# Altium footprint library LimeMicroAltiumLib_pcbLib.PcbLib: 279 footprints (part 6 of 18) (continued)
## FMC_LPC_conn [mm] (continued)
3D body: height 6.55, standoff 2.16, extent -1.799,-23.241 -0.828,-22.479
3D body: height 6.55, standoff 2.16, extent -1.799,-21.971 -0.828,-21.209
3D body: height 6.55, standoff 2.16, extent -1.799,-20.701 -0.828,-19.939
3D body: height 6.55, standoff 2.16, extent -1.799,-19.431 -0.828,-18.669
3D body: height 6.55, standoff 2.16, extent -1.799,-18.161 -0.828,-17.399
3D body: height 6.55, standoff 2.16, extent -1.799,-16.891 -0.828,-16.129
3D body: height 6.55, standoff 2.16, extent -1.799,-15.621 -0.828,-14.859
3D body: height 6.55, standoff 2.16, extent -1.799,-14.351 -0.828,-13.589
3D body: height 6.55, standoff 2.16, extent -1.799,-13.081 -0.828,-12.319
3D body: height 6.55, standoff 2.16, extent -1.799,-11.811 -0.828,-11.049
3D body: height 6.55, standoff 2.16, extent -1.799,-10.541 -0.828,-9.779
3D body: height 6.55, standoff 2.16, extent -1.799,-9.271 -0.828,-8.509
3D body: height 6.55, standoff 2.16, extent -1.799,-8.001 -0.828,-7.239
3D body: height 6.55, standoff 2.16, extent -1.799,-6.731 -0.828,-5.969
3D body: height 6.55, standoff 2.16, extent -1.799,-5.461 -0.828,-4.699
3D body: height 6.55, standoff 2.16, extent -1.799,-4.191 -0.828,-3.429
3D body: height 6.55, standoff 2.16, extent -1.799,-2.921 -0.828,-2.159
3D body: height 6.55, standoff 2.16, extent -1.799,-1.651 -0.828,-0.889
3D body: height 6.55, standoff 2.16, extent -1.799,-0.381 -0.828,0.381
3D body: height 6.55, standoff 2.16, extent -1.799,0.889 -0.828,1.651
3D body: height 6.55, standoff 2.16, extent -1.799,2.159 -0.828,2.921
3D body: height 6.55, standoff 2.16, extent -1.799,3.429 -0.828,4.191
3D body: height 6.55, standoff 2.16, extent -1.799,4.699 -0.828,5.461
3D body: height 6.55, standoff 2.16, extent -1.799,5.969 -0.828,6.731
3D body: height 6.55, standoff 2.16, extent -1.799,7.239 -0.828,8.001
3D body: height 6.55, standoff 2.16, extent -1.799,8.509 -0.828,9.271
3D body: height 6.55, standoff 2.16, extent -1.799,9.779 -0.828,10.541
3D body: height 6.55, standoff 2.16, extent -1.799,11.049 -0.828,11.811
3D body: height 6.55, standoff 2.16, extent -1.799,12.319 -0.828,13.081
3D body: height 6.55, standoff 2.16, extent -1.799,13.589 -0.828,14.351
3D body: height 6.55, standoff 2.16, extent -1.799,14.859 -0.828,15.621
3D body: height 6.55, standoff 2.16, extent -1.799,16.129 -0.828,16.891
3D body: height 6.55, standoff 2.16, extent -1.799,17.399 -0.828,18.161
3D body: height 6.55, standoff 2.16, extent -1.799,18.669 -0.828,19.431
3D body: height 6.55, standoff 2.16, extent -1.799,19.939 -0.828,20.701
3D body: height 6.55, standoff 2.16, extent -1.799,21.209 -0.828,21.971
3D body: height 6.55, standoff 2.16, extent -1.799,22.479 -0.828,23.241
3D body: height 6.55, standoff 2.16, extent -1.799,23.749 -0.828,24.511
3D body: height 6.55, standoff 2.16, extent -1.799,25.019 -0.828,25.502
3D body: height 6.24, standoff 2.16, extent -1.383,-25.019 -1.244,25.019
3D body: height 6.55, standoff 2.16, extent -4.339,-25.502 -3.368,-25.019
3D body: height 6.55, standoff 2.16, extent -4.339,-24.511 -3.368,-23.749
3D body: height 6.55, standoff 2.16, extent -4.339,-23.241 -3.368,-22.479
3D body: height 6.55, standoff 2.16, extent -4.339,-21.971 -3.368,-21.209
3D body: height 6.55, standoff 2.16, extent -4.339,-20.701 -3.368,-19.939
3D body: height 6.55, standoff 2.16, extent -4.339,-19.431 -3.368,-18.669
3D body: height 6.55, standoff 2.16, extent -4.339,-18.161 -3.368,-17.399
3D body: height 6.55, standoff 2.16, extent -4.339,-16.891 -3.368,-16.129
3D body: height 6.55, standoff 2.16, extent -4.339,-15.621 -3.368,-14.859
3D body: height 6.55, standoff 2.16, extent -4.339,-14.351 -3.368,-13.589
3D body: height 6.55, standoff 2.16, extent -4.339,-13.081 -3.368,-12.319
3D body: height 6.55, standoff 2.16, extent -4.339,-11.811 -3.368,-11.049
3D body: height 6.55, standoff 2.16, extent -4.339,-10.541 -3.368,-9.779
3D body: height 6.55, standoff 2.16, extent -4.339,-9.271 -3.368,-8.509
3D body: height 6.55, standoff 2.16, extent -4.339,-8.001 -3.368,-7.239
3D body: height 6.55, standoff 2.16, extent -4.339,-6.731 -3.368,-5.969
3D body: height 6.55, standoff 2.16, extent -4.339,-5.461 -3.368,-4.699
3D body: height 6.55, standoff 2.16, extent -4.339,-4.191 -3.368,-3.429
3D body: height 6.55, standoff 2.16, extent -4.339,-2.921 -3.368,-2.159
3D body: height 6.55, standoff 2.16, extent -4.339,-1.651 -3.368,-0.889
3D body: height 6.55, standoff 2.16, extent -4.339,-0.381 -3.368,0.381
3D body: height 6.55, standoff 2.16, extent -4.339,0.889 -3.368,1.651
3D body: height 6.55, standoff 2.16, extent -4.339,2.159 -3.368,2.921
3D body: height 6.55, standoff 2.16, extent -4.339,3.429 -3.368,4.191
3D body: height 6.55, standoff 2.16, extent -4.339,4.699 -3.368,5.461
3D body: height 6.55, standoff 2.16, extent -4.339,5.969 -3.368,6.731
3D body: height 6.55, standoff 2.16, extent -4.339,7.239 -3.368,8.001
3D body: height 6.55, standoff 2.16, extent -4.339,8.509 -3.368,9.271
3D body: height 6.55, standoff 2.16, extent -4.339,9.779 -3.368,10.541
3D body: height 6.55, standoff 2.16, extent -4.339,11.049 -3.368,11.811
3D body: height 6.55, standoff 2.16, extent -4.339,12.319 -3.368,13.081
3D body: height 6.55, standoff 2.16, extent -4.339,13.589 -3.368,14.351
3D body: height 6.55, standoff 2.16, extent -4.339,14.859 -3.368,15.621
3D body: height 6.55, standoff 2.16, extent -4.339,16.129 -3.368,16.891
3D body: height 6.55, standoff 2.16, extent -4.339,17.399 -3.368,18.161
3D body: height 6.55, standoff 2.16, extent -4.339,18.669 -3.368,19.431
3D body: height 6.55, standoff 2.16, extent -4.339,19.939 -3.368,20.701
3D body: height 6.55, standoff 2.16, extent -4.339,21.209 -3.368,21.971
3D body: height 6.55, standoff 2.16, extent -4.339,22.479 -3.368,23.241
3D body: height 6.55, standoff 2.16, extent -4.339,23.749 -3.368,24.511
3D body: height 6.55, standoff 2.16, extent -4.339,25.019 -3.368,25.502
3D body: height 6.24, standoff 2.16, extent -3.923,-25.019 -3.784,25.019
3D body: height 3.51, standoff 1.92, extent -6.659,-28.728 6.576,28.728
3D body: height 2, standoff -1.27, extent 2.503,26.74 3.597,27.619
3D body: height 6.55, standoff 2.16, extent 5.812,-28.727 6.577,27.891
3D body: height 6.55, standoff 2.16, extent -6.662,-28.727 -5.897,27.89
3D body: height 6.24, standoff 2.16, extent 3.697,-25.019 3.836,25.019

## FMC_LPC_female_conn [mm]
pads (164):
  round 0.9 smd: C1(3.175,-24.765) C2(3.175,-23.495) C3(3.175,-22.225) C4(3.175,-20.955) C5(3.175,-19.685) C6(3.175,-18.415) C7(3.175,-17.145) C8(3.175,-15.875) C9(3.175,-14.605) C10(3.175,-13.335) C11(3.175,-12.065) C12(3.175,-10.795) C13(3.175,-9.525) C14(3.175,-8.255) C15(3.175,-6.985) C16(3.175,-5.715) C17(3.175,-4.445) C18(3.175,-3.175) C19(3.175,-1.905) C20(3.175,-0.635) C21(3.175,0.635) C22(3.175,1.905) C23(3.175,3.175) C24(3.175,4.445) C25(3.175,5.715) C26(3.175,6.985) C27(3.175,8.255) C28(3.175,9.525) C29(3.175,10.795) C30(3.175,12.065) C31(3.175,13.335) C32(3.175,14.605) C33(3.175,15.875) C34(3.175,17.145) C35(3.175,18.415) C36(3.175,19.685) C37(3.175,20.955) C38(3.175,22.225) C39(3.175,23.495) C40(3.175,24.765) D1(1.905,-24.765) D2(1.905,-23.495) D3(1.905,-22.225) D4(1.905,-20.955) D5(1.905,-19.685) D6(1.905,-18.415) D7(1.905,-17.145) D8(1.905,-15.875) D9(1.905,-14.605) D10(1.905,-13.335) D11(1.905,-12.065) D12(1.905,-10.795) D13(1.905,-9.525) D14(1.905,-8.255) D15(1.905,-6.985) D16(1.905,-5.715) D17(1.905,-4.445) D18(1.905,-3.175) D19(1.905,-1.905) D20(1.905,-0.635) D21(1.905,0.635) D22(1.905,1.905) D23(1.905,3.175) D24(1.905,4.445) D25(1.905,5.715) D26(1.905,6.985) D27(1.905,8.255) D28(1.905,9.525) D29(1.905,10.795) D30(1.905,12.065) D31(1.905,13.335) D32(1.905,14.605) D33(1.905,15.875) D34(1.905,17.145) D35(1.905,18.415) D36(1.905,19.685) D37(1.905,20.955) D38(1.905,22.225) D39(1.905,23.495) D40(1.905,24.765) G1(-1.905,-24.765) G2(-1.905,-23.495) G3(-1.905,-22.225) G4(-1.905,-20.955) G5(-1.905,-19.685) G6(-1.905,-18.415) G7(-1.905,-17.145) G8(-1.905,-15.875) G9(-1.905,-14.605) G10(-1.905,-13.335) G11(-1.905,-12.065) G12(-1.905,-10.795) G13(-1.905,-9.525) G14(-1.905,-8.255) G15(-1.905,-6.985) G16(-1.905,-5.715) G17(-1.905,-4.445) G18(-1.905,-3.175) G19(-1.905,-1.905) G20(-1.905,-0.635) G21(-1.905,0.635) G22(-1.905,1.905) G23(-1.905,3.175) G24(-1.905,4.445) G25(-1.905,5.715) G26(-1.905,6.985) G27(-1.905,8.255) G28(-1.905,9.525) G29(-1.905,10.795) G30(-1.905,12.065) G31(-1.905,13.335) G32(-1.905,14.605) G33(-1.905,15.875) G34(-1.905,17.145) G35(-1.905,18.415) G36(-1.905,19.685) G37(-1.905,20.955) G38(-1.905,22.225) G39(-1.905,23.495) G40(-1.905,24.765) H1(-3.175,-24.765) H2(-3.175,-23.495) H3(-3.175,-22.225) H4(-3.175,-20.955) H5(-3.175,-19.685) H6(-3.175,-18.415) H7(-3.175,-17.145) H8(-3.175,-15.875) H9(-3.175,-14.605) H10(-3.175,-13.335) H11(-3.175,-12.065) H12(-3.175,-10.795) H13(-3.175,-9.525) H14(-3.175,-8.255) H15(-3.175,-6.985) H16(-3.175,-5.715) H17(-3.175,-4.445) H18(-3.175,-3.175) H19(-3.175,-1.905) H20(-3.175,-0.635) H21(-3.175,0.635) H22(-3.175,1.905) H23(-3.175,3.175) H24(-3.175,4.445) H25(-3.175,5.715) H26(-3.175,6.985) H27(-3.175,8.255) H28(-3.175,9.525) H29(-3.175,10.795) H30(-3.175,12.065) H31(-3.175,13.335) H32(-3.175,14.605) H33(-3.175,15.875) H34(-3.175,17.145) H35(-3.175,18.415) H36(-3.175,19.685) H37(-3.175,20.955) H38(-3.175,22.225) H39(-3.175,23.495) H40(-3.175,24.765)
  round 3.2 hole 2.7: MH1(-1.98,-31.5) MH2(-1.98,31.5)
  round 0.97 hole 1.27 unplated: MH1(0,-27.18) MH2(-3.05,27.18)
Top Layer keep-out:
  region: -1.98,28.6 -2.17,28.6 -2.547,28.65 -2.914,28.748 -3.265,28.893 -3.595,29.084 -3.896,29.315 -4.165,29.584 -4.396,29.885 -4.587,30.215 -4.732,30.566 -4.83,30.933 -4.88,31.31 -4.88,31.5 -4.88,31.69 -4.83,32.067 -4.732,32.434 -4.587,32.785 -4.396,33.115 -4.165,33.416 -3.896,33.685 -3.595,33.916 -3.265,34.107 -2.914,34.252 -2.547,34.35 -2.17,34.4 -1.98,34.4 -1.79,34.4 -1.413,34.35 -1.046,34.252 -0.695,34.107 -0.365,33.916 -0.064,33.685 0.205,33.416 0.436,33.115 0.627,32.785 0.772,32.434 0.87,32.067 0.92,31.69 0.92,31.5 0.92,31.31 0.87,30.933 0.772,30.566 0.627,30.215 0.436,29.885 0.205,29.584 -0.064,29.315 -0.365,29.084 -0.695,28.893 -1.046,28.748 -1.413,28.65 -1.79,28.6
  region: -1.98,-34.4 -2.17,-34.4 -2.547,-34.35 -2.914,-34.252 -3.265,-34.107 -3.595,-33.916 -3.896,-33.685 -4.165,-33.416 -4.396,-33.115 -4.587,-32.785 -4.732,-32.434 -4.83,-32.067 -4.88,-31.69 -4.88,-31.5 -4.88,-31.31 -4.83,-30.933 -4.732,-30.566 -4.587,-30.215 -4.396,-29.885 -4.165,-29.584 -3.896,-29.315 -3.595,-29.084 -3.265,-28.893 -2.914,-28.748 -2.547,-28.65 -2.17,-28.6 -1.98,-28.6 -1.79,-28.6 -1.413,-28.65 -1.046,-28.748 -0.695,-28.893 -0.365,-29.084 -0.064,-29.315 0.205,-29.584 0.436,-29.885 0.627,-30.215 0.772,-30.566 0.87,-30.933 0.92,-31.31 0.92,-31.5 0.92,-31.69 0.87,-32.067 0.772,-32.434 0.627,-32.785 0.436,-33.115 0.205,-33.416 -0.064,-33.685 -0.365,-33.916 -0.695,-34.107 -1.046,-34.252 -1.413,-34.35 -1.79,-34.4
Top Overlay:
  lines w0.2: -6.662,-27.89 -6.662,28.727 ; -6.66,-27.889 -0.5,-27.889 -0.5,-28.727 0.5,-28.727 0.5,-27.9 0.511,-27.889 4,-27.889 6.573,-27.889 6.573,28.727 ; -6.66,28.727 2.153,28.727 6.574,28.727
  text "K" at -5.3,29.375 h1.1
  text "A" at 6.3,29.5 h1.1
  text "1" at -7.5,-25 h1.1
  text "40" at -7.6,23.7 h1.1
Mechanical 15:
  lines w0.1: -0.5,0 0.5,0 ; 0,-0.5 0,0.5 ; -6.862,-28.089 -6.862,28.927 -2.041,28.927 1.953,28.927 6.773,28.927 6.773,-28.089 0.5,-28.089 0.5,-28.927 -0.5,-28.927 -0.5,-28.089 -6.862,-28.089
  text "40" at -4.6,23.6 h1.1
  text "1" at -4.4,-24.9 h1.1
  text "A" at 4.65,25.875 h1.1
  text "K" at -4.05,26.225 h1.1
  text ".Designator" at 0,0 h0.7

## FMC_LPC_male [mm]
pads (164):
  round 0.9 smd: C1(3.175,-24.765) C2(3.175,-23.495) C3(3.175,-22.225) C4(3.175,-20.955) C5(3.175,-19.685) C6(3.175,-18.415) C7(3.175,-17.145) C8(3.175,-15.875) C9(3.175,-14.605) C10(3.175,-13.335) C11(3.175,-12.065) C12(3.175,-10.795) C13(3.175,-9.525) C14(3.175,-8.255) C15(3.175,-6.985) C16(3.175,-5.715) C17(3.175,-4.445) C18(3.175,-3.175) C19(3.175,-1.905) C20(3.175,-0.635) C21(3.175,0.635) C22(3.175,1.905) C23(3.175,3.175) C24(3.175,4.445) C25(3.175,5.715) C26(3.175,6.985) C27(3.175,8.255) C28(3.175,9.525) C29(3.175,10.795) C30(3.175,12.065) C31(3.175,13.335) C32(3.175,14.605) C33(3.175,15.875) C34(3.175,17.145) C35(3.175,18.415) C36(3.175,19.685) C37(3.175,20.955) C38(3.175,22.225) C39(3.175,23.495) C40(3.175,24.765) D1(1.905,-24.765) D2(1.905,-23.495) D3(1.905,-22.225) D4(1.905,-20.955) D5(1.905,-19.685) D6(1.905,-18.415) D7(1.905,-17.145) D8(1.905,-15.875) D9(1.905,-14.605) D10(1.905,-13.335) D11(1.905,-12.065) D12(1.905,-10.795) D13(1.905,-9.525) D14(1.905,-8.255) D15(1.905,-6.985) D16(1.905,-5.715) D17(1.905,-4.445) D18(1.905,-3.175) D19(1.905,-1.905) D20(1.905,-0.635) D21(1.905,0.635) D22(1.905,1.905) D23(1.905,3.175) D24(1.905,4.445) D25(1.905,5.715) D26(1.905,6.985) D27(1.905,8.255) D28(1.905,9.525) D29(1.905,10.795) D30(1.905,12.065) D31(1.905,13.335) D32(1.905,14.605) D33(1.905,15.875) D34(1.905,17.145) D35(1.905,18.415) D36(1.905,19.685) D37(1.905,20.955) D38(1.905,22.225) D39(1.905,23.495) D40(1.905,24.765) G1(-1.905,-24.765) G2(-1.905,-23.495) G3(-1.905,-22.225) G4(-1.905,-20.955) G5(-1.905,-19.685) G6(-1.905,-18.415) G7(-1.905,-17.145) G8(-1.905,-15.875) G9(-1.905,-14.605) G10(-1.905,-13.335) G11(-1.905,-12.065) G12(-1.905,-10.795) G13(-1.905,-9.525) G14(-1.905,-8.255) G15(-1.905,-6.985) G16(-1.905,-5.715) G17(-1.905,-4.445) G18(-1.905,-3.175) G19(-1.905,-1.905) G20(-1.905,-0.635) G21(-1.905,0.635) G22(-1.905,1.905) G23(-1.905,3.175) G24(-1.905,4.445) G25(-1.905,5.715) G26(-1.905,6.985) G27(-1.905,8.255) G28(-1.905,9.525) G29(-1.905,10.795) G30(-1.905,12.065) G31(-1.905,13.335) G32(-1.905,14.605) G33(-1.905,15.875) G34(-1.905,17.145) G35(-1.905,18.415) G36(-1.905,19.685) G37(-1.905,20.955) G38(-1.905,22.225) G39(-1.905,23.495) G40(-1.905,24.765) H1(-3.175,-24.765) H2(-3.175,-23.495) H3(-3.175,-22.225) H4(-3.175,-20.955) H5(-3.175,-19.685) H6(-3.175,-18.415) H7(-3.175,-17.145) H8(-3.175,-15.875) H9(-3.175,-14.605) H10(-3.175,-13.335) H11(-3.175,-12.065) H12(-3.175,-10.795) H13(-3.175,-9.525) H14(-3.175,-8.255) H15(-3.175,-6.985) H16(-3.175,-5.715) H17(-3.175,-4.445) H18(-3.175,-3.175) H19(-3.175,-1.905) H20(-3.175,-0.635) H21(-3.175,0.635) H22(-3.175,1.905) H23(-3.175,3.175) H24(-3.175,4.445) H25(-3.175,5.715) H26(-3.175,6.985) H27(-3.175,8.255) H28(-3.175,9.525) H29(-3.175,10.795) H30(-3.175,12.065) H31(-3.175,13.335) H32(-3.175,14.605) H33(-3.175,15.875) H34(-3.175,17.145) H35(-3.175,18.415) H36(-3.175,19.685) H37(-3.175,20.955) H38(-3.175,22.225) H39(-3.175,23.495) H40(-3.175,24.765)
  round 3.2 hole 2.7: MH1(-1.98,-31.5) MH2(-1.98,31.5)
  round 0.97 hole 1.27 unplated: MH1(0,-27.18) MH2(-3.05,27.18)
Top Layer keep-out:
  region: -1.98,28.6 -2.17,28.6 -2.547,28.65 -2.914,28.748 -3.265,28.893 -3.595,29.084 -3.896,29.315 -4.165,29.584 -4.396,29.885 -4.587,30.215 -4.732,30.566 -4.83,30.933 -4.88,31.31 -4.88,31.5 -4.88,31.69 -4.83,32.067 -4.732,32.434 -4.587,32.785 -4.396,33.115 -4.165,33.416 -3.896,33.685 -3.595,33.916 -3.265,34.107 -2.914,34.252 -2.547,34.35 -2.17,34.4 -1.98,34.4 -1.79,34.4 -1.413,34.35 -1.046,34.252 -0.695,34.107 -0.365,33.916 -0.064,33.685 0.205,33.416 0.436,33.115 0.627,32.785 0.772,32.434 0.87,32.067 0.92,31.69 0.92,31.5 0.92,31.31 0.87,30.933 0.772,30.566 0.627,30.215 0.436,29.885 0.205,29.584 -0.064,29.315 -0.365,29.084 -0.695,28.893 -1.046,28.748 -1.413,28.65 -1.79,28.6
  region: -1.98,-34.4 -2.17,-34.4 -2.547,-34.35 -2.914,-34.252 -3.265,-34.107 -3.595,-33.916 -3.896,-33.685 -4.165,-33.416 -4.396,-33.115 -4.587,-32.785 -4.732,-32.434 -4.83,-32.067 -4.88,-31.69 -4.88,-31.5 -4.88,-31.31 -4.83,-30.933 -4.732,-30.566 -4.587,-30.215 -4.396,-29.885 -4.165,-29.584 -3.896,-29.315 -3.595,-29.084 -3.265,-28.893 -2.914,-28.748 -2.547,-28.65 -2.17,-28.6 -1.98,-28.6 -1.79,-28.6 -1.413,-28.65 -1.046,-28.748 -0.695,-28.893 -0.365,-29.084 -0.064,-29.315 0.205,-29.584 0.436,-29.885 0.627,-30.215 0.772,-30.566 0.87,-30.933 0.92,-31.31 0.92,-31.5 0.92,-31.69 0.87,-32.067 0.772,-32.434 0.627,-32.785 0.436,-33.115 0.205,-33.416 -0.064,-33.685 -0.365,-33.916 -0.695,-34.107 -1.046,-34.252 -1.413,-34.35 -1.79,-34.4
Top Overlay:
  lines w0.2: -6.662,-27.89 -6.662,28.025 1.451,28.025 6.573,28.025 6.573,-27.889 4,-27.889 0.511,-27.889 0.5,-27.9 0.5,-28.727 -0.5,-28.727 -0.5,-27.889 -6.66,-27.889
  text "K" at -5.3,29.375 h1.1
  text "A" at 6.3,29.5 h1.1
  text "1" at -7.5,-25 h1.1
  text "40" at -7.6,23.7 h1.1
Mechanical 15:
  lines w0.1: -0.5,0 0.5,0 ; 0,-0.5 0,0.5 ; -6.862,-28.089 -6.862,28 6.773,28 6.773,-28.089 0.5,-28.089 0.5,-28.927 -0.5,-28.927 -0.5,-28.089 -6.862,-28.089
  text "40" at -4.6,23.6 h1.1
  text "1" at -4.4,-24.9 h1.1
  text "A" at 4.65,25.875 h1.1
  text "K" at -4.05,26.225 h1.1
  text ".Designator" at 0,0 h0.7
3D body "SEAM-40-02.0-L-10-2-A.STEP": height 5.76, standoff -1.12, extent -7.456,-27.864 7.225,27.914

## FPF3042 [mm]
pads (16):
  round 0.2 smd mask+0.05: A1(-0.6,0.6) A2(-0.2,0.6) A3(0.2,0.6) A4(0.6,0.6) B1(-0.6,0.2) B2(-0.2,0.2) B3(0.2,0.2) B4(0.6,0.2) C1(-0.6,-0.2) C2(-0.2,-0.2) C3(0.2,-0.2) C4(0.6,-0.2) D1(-0.6,-0.6) D2(-0.2,-0.6) D3(0.2,-0.6) D4(0.6,-0.6)
Top Overlay:
  lines w0.15: -0.9,-0.9 0.9,-0.9 0.9,0.9 -0.9,0.9 -0.9,-0.9
Mechanical 15:
  circle w0.254: c-0.6,0.6 r0.1
  lines w0.15: -0.9,-0.9 0.9,-0.9 0.9,0.9 -0.9,0.9 -0.9,-0.9
  text ".Designator" at 0,0 h0.7
3D body: height 1.5, standoff 0, extent -0.8,-0.8 0.8,0.8

## FT601Q [mm] "QFN, 76-Leads, Body 9,05x9,05mm, Pitch 0,40mm, Thermal Pad 5,55x5,55mm, IPC High Density"
height 1
pads (77):
  rect 0.9x0.2 smd mask+0.05: 1(-4.5,3.6) 2(-4.5,3.2) 3(-4.5,2.8) 4(-4.5,2.4) 5(-4.5,2) 6(-4.5,1.6) 7(-4.5,1.2) 8(-4.5,0.8) 9(-4.5,0.4) 10(-4.5,0) 11(-4.5,-0.4) 12(-4.5,-0.8) 13(-4.5,-1.2) 14(-4.5,-1.6) 15(-4.5,-2) 16(-4.5,-2.4) 17(-4.5,-2.8) 18(-4.5,-3.2) 19(-4.5,-3.6) 39(4.5,-3.6) 40(4.5,-3.2) 41(4.5,-2.8) 42(4.5,-2.4) 43(4.5,-2) 44(4.5,-1.6) 45(4.5,-1.2) 46(4.5,-0.8) 47(4.5,-0.4) 48(4.5,0) 49(4.5,0.4) 50(4.5,0.8) 51(4.5,1.2) 52(4.5,1.6) 53(4.5,2) 54(4.5,2.4) 55(4.5,2.8) 56(4.5,3.2) 57(4.5,3.6)
  rect 0.2x0.9 smd mask+0.05: 20(-3.6,-4.5) 21(-3.2,-4.5) 22(-2.8,-4.5) 23(-2.4,-4.5) 24(-2,-4.5) 25(-1.6,-4.5) 26(-1.2,-4.5) 27(-0.8,-4.5) 28(-0.4,-4.5) 29(0,-4.5) 30(0.4,-4.5) 31(0.8,-4.5) 32(1.2,-4.5) 33(1.6,-4.5) 34(2,-4.5) 35(2.4,-4.5) 36(2.8,-4.5) 37(3.2,-4.5) 38(3.6,-4.5) 58(3.6,4.5) 59(3.2,4.5) 60(2.8,4.5) 61(2.4,4.5) 62(2,4.5) 63(1.6,4.5) 64(1.2,4.5) 65(0.8,4.5) 66(0.4,4.5) 67(0,4.5) 68(-0.4,4.5) 69(-0.8,4.5) 70(-1.2,4.5) 71(-1.6,4.5) 72(-2,4.5) 73(-2.4,4.5) 74(-2.8,4.5) 75(-3.2,4.5) 76(-3.6,4.5)
  rect 5.55x5.55 smd: 77(0,0)
via -2.2,2.2 diameter 0.5 hole 0.2
via -1.1,2.2 diameter 0.5 hole 0.2
via 0,2.2 diameter 0.5 hole 0.2
via 1.1,2.2 diameter 0.5 hole 0.2
via 2.2,2.2 diameter 0.5 hole 0.2
via -2.2,1.1 diameter 0.5 hole 0.2
via -1.1,1.1 diameter 0.5 hole 0.2
via 0,1.1 diameter 0.5 hole 0.2
via 1.1,1.1 diameter 0.5 hole 0.2
via 2.2,1.1 diameter 0.5 hole 0.2
via -2.2,0 diameter 0.5 hole 0.2
via -1.1,0 diameter 0.5 hole 0.2
via 0,0 diameter 0.5 hole 0.2
via 1.1,0 diameter 0.5 hole 0.2
via 2.2,0 diameter 0.5 hole 0.2
via -2.2,-1.1 diameter 0.5 hole 0.2
via -1.1,-1.1 diameter 0.5 hole 0.2
via 0,-1.1 diameter 0.5 hole 0.2
via 1.1,-1.1 diameter 0.5 hole 0.2
via 2.2,-1.1 diameter 0.5 hole 0.2
via -2.2,-2.2 diameter 0.5 hole 0.2
via -1.1,-2.2 diameter 0.5 hole 0.2
via 0,-2.2 diameter 0.5 hole 0.2
via 1.1,-2.2 diameter 0.5 hole 0.2
via 2.2,-2.2 diameter 0.5 hole 0.2
Top Overlay:
  circle w0.25: c-5.275,3.625 r0.025
  lines w0.2: -4.7,-4.1 -4.1,-4.7 ; -4.7,4.1 -4.1,4.7 ; 4.1,-4.7 4.7,-4.1 ; 4.1,4.7 4.7,4.1
Mechanical 13:
  circle w0.1: c-3.65,3.65 r0.5
  lines w0.1: -4.55,-3.95 -3.95,-4.55 3.95,-4.55 4.55,-3.95 4.55,3.95 3.95,4.55 -3.95,4.55 -4.55,3.95 -4.55,-3.95
Mechanical 15:
  circle w0.4: c-4.475,3.6 r0.035
  lines w0.05: -5.1,-5.1 -5.1,5.1 5.1,5.1 5.1,-5.1 -5.1,-5.1
  lines w0.1: -0.5,0 0.5,0 ; 0,-0.5 0,0.5
  text ".Designator" at 0,0 h0.55
3D body "FT601Q_1.step": height 1, standoff 0, extent -4.56,-4.56 4.56,4.56

## FT2232HL_LQFP-64_M [mm] "Thin QFP, 64-Leads, Body 10x10mm, Pitch 0.5mm, IPC Low Density"
height 1.6
pads (64):
  oval 2.1x0.3 smd: 1(-5.6,3.75) 2(-5.6,3.25) 3(-5.6,2.75) 4(-5.6,2.25) 5(-5.6,1.75) 6(-5.6,1.25) 7(-5.6,0.75) 8(-5.6,0.25) 9(-5.6,-0.25) 10(-5.6,-0.75) 11(-5.6,-1.25) 12(-5.6,-1.75) 13(-5.6,-2.25) 14(-5.6,-2.75) 15(-5.6,-3.25) 16(-5.6,-3.75) 33(5.6,-3.75) 34(5.6,-3.25) 35(5.6,-2.75) 36(5.6,-2.25) 37(5.6,-1.75) 38(5.6,-1.25) 39(5.6,-0.75) 40(5.6,-0.25) 41(5.6,0.25) 42(5.6,0.75) 43(5.6,1.25) 44(5.6,1.75) 45(5.6,2.25) 46(5.6,2.75) 47(5.6,3.25) 48(5.6,3.75)
  oval 0.3x2.1 smd: 17(-3.75,-5.6) 18(-3.25,-5.6) 19(-2.75,-5.6) 20(-2.25,-5.6) 21(-1.75,-5.6) 22(-1.25,-5.6) 23(-0.75,-5.6) 24(-0.25,-5.6) 25(0.25,-5.6) 26(0.75,-5.6) 27(1.25,-5.6) 28(1.75,-5.6) 29(2.25,-5.6) 30(2.75,-5.6) 31(3.25,-5.6) 32(3.75,-5.6) 49(3.75,5.6) 50(3.25,5.6) 51(2.75,5.6) 52(2.25,5.6) 53(1.75,5.6) 54(1.25,5.6) 55(0.75,5.6) 56(0.25,5.6) 57(-0.25,5.6) 58(-0.75,5.6) 59(-1.25,5.6) 60(-1.75,5.6) 61(-2.25,5.6) 62(-2.75,5.6) 63(-3.25,5.6) 64(-3.75,5.6)
Top Overlay:
  circle w0.25: c-5.6,4.45 r0.125
  circle w0.6: c-3.15,3.15 r0.3
  lines w0.2: -4.15,-4.15 -4.15,4.15 4.15,4.15 4.15,-4.15 -4.15,-4.15
Mechanical 13:
  circle w0.1: c-4.1,4.1 r0.5
  lines w0.1: -5,-5 -5,5 5,5 5,-5 -5,-5
Mechanical 15:
  circle w0.35: c-5.6,4.5 r0.1
  lines w0.1: -0.5,0 0.5,0 ; 0,-0.5 0,0.5 ; -7.15,-7.15 -7.15,7.15 7.15,7.15 7.15,-7.15 -7.15,-7.15
  text ".Designator" at 0,0 h0.7
3D body "User Library-LQFP-64-1.step": height 1.5, standoff 0, extent -6,-5 6,5
3D body "User Library-LQFP-64-1.step": height 1.45, standoff -0.05, extent -5,-6 5,6

## FX10B-80S/8-SV [mm]
pads (92):
  rect 0.3x1.6 smd mask+0.05: 1(-11.75,3.061) 2(-11.75,-3.061) 3(-11.25,3.061) 4(-11.25,-3.061) 5(-10.75,3.061) 6(-10.75,-3.061) 7(-10.25,3.061) 8(-10.25,-3.061) 9(-9.75,3.061) 10(-9.75,-3.061) 11(-8.24,3.061) 12(-8.24,-3.061) 13(-7.75,3.061) 14(-7.75,-3.061) 15(-7.25,3.061) 16(-7.25,-3.061) 17(-6.75,3.061) 18(-6.75,-3.061) 19(-6.25,3.061) 20(-6.25,-3.061) 21(-5.75,3.061) 22(-5.75,-3.061) 23(-5.25,3.061) 24(-5.25,-3.061) 25(-4.75,3.061) 26(-4.75,-3.061) 27(-4.25,3.061) 28(-4.25,-3.061) 29(-3.75,3.061) 30(-3.75,-3.061) 31(-2.25,3.061) 32(-2.25,-3.061) 33(-1.75,3.061) 34(-1.75,-3.061) 35(-1.25,3.061) 36(-1.25,-3.061) 37(-0.75,3.061) 38(-0.75,-3.061) 39(-0.25,3.061) 40(-0.25,-3.061) 41(0.25,3.061) 42(0.25,-3.061) 43(0.75,3.061) 44(0.75,-3.061) 45(1.25,3.061) 46(1.25,-3.061) 47(1.75,3.061) 48(1.75,-3.061) 49(2.25,3.061) 50(2.25,-3.061) 51(3.75,3.061) 52(3.75,-3.061) 53(4.25,3.061) 54(4.25,-3.061) 55(4.75,3.061) 56(4.75,-3.061) 57(5.25,3.061) 58(5.25,-3.061) 59(5.75,3.061) 60(5.75,-3.061) 61(6.25,3.061) 62(6.25,-3.061) 63(6.75,3.061) 64(6.75,-3.061) 65(7.25,3.061) 66(7.25,-3.061) 67(7.75,3.061) 68(7.75,-3.061) 69(8.25,3.061) 70(8.25,-3.061) 71(9.75,3.061) 72(9.75,-3.061) 73(10.25,3.061) 74(10.25,-3.061) 75(10.75,3.061) 76(10.75,-3.061) 77(11.25,3.061) 78(11.25,-3.061) 79(11.75,3.061) 80(11.75,-3.061)
  rect 0.7x1.6 smd mask+0.05: 81(-9,3.061) 82(-9,-3.061) 83(-3,3.061) 84(-3,-3.061) 85(3,3.061) 86(3,-3.061) 87(9,3.061) 88(9,-3.061)
  round 1 hole 1.19: 89(13.2,0) 90(-13.2,0)
  rect 1.6x3 smd: 89(14.95,0) 90(-14.95,0)
Top Overlay:
  lines w0.254: -16,-0.25 -16,2.5 -14.25,4.25 16,4.25 16,4 16,-4.25 -16,-4.25 -16,0
  text "1" at -11.5,5 h1.1
  text "79" at 11.75,5 h1.1
Mechanical 15:
  lines w0.254: -16,-0.25 -16,2.5 -14.25,4.25 16,4.25 16,4 16,-4.25 -16,-4.25 -16,0
  text ".Designator" at 0,0 h0.7

## FXLA108 [mm] "PQFN, 20-Leads, Body 2,50x4,50mm, Pitch 0,50mm, Thermal Pad 1,00x2,55mm, IPC Medium Density"
height 0.8
pads (21):
  rect 0.35x0.9 smd mask+0.05: 1(-0.25,2.225) 10(-0.25,-2.225) 11(0.25,-2.225) 20(0.25,2.225)
  rect 0.9x0.35 smd mask+0.05: 2(-1.35,1.75) 3(-1.35,1.25) 4(-1.35,0.75) 5(-1.35,0.25) 6(-1.35,-0.25) 7(-1.35,-0.75) 8(-1.35,-1.25) 9(-1.35,-1.75) 12(1.35,-1.725) 13(1.35,-1.225) 14(1.35,-0.725) 15(1.35,-0.225) 16(1.35,0.275) 17(1.35,0.775) 18(1.35,1.275) 19(1.35,1.775)
  rect 1x2.55 smd mask+0.05: 21(0,0)
Top Overlay:
  circle w0.25: c-0.25,3.5 r0.125
  lines w0.2: -2.25,-3 -2.25,3 2.25,3 2.25,-3 -2.25,-3
Mechanical 13:
  circle w0.1: c-0.35,1.35 r0.5
  lines w0.1: -1.25,-2.25 1.25,-2.25 1.25,2.25 -1.25,2.25 -1.25,-2.25
Mechanical 15:
  circle w0.35: c-0.3,3.5 r0.1
  lines w0.05: -1.5,-2.5 1.5,-2.5 1.5,2.5 -1.5,2.5 -1.5,-2.5
  lines w0.1: -0.5,0 0.5,0 ; 0,-0.5 0,0.5
  text ".Designator" at 0,0 h0.7
3D body: height 0.8, standoff 0, extent -1.25,-2.25 1.25,2.25

## HDR1X6 [mm] "Connector; Header; 6 Position"
pads (6):
  rect 1.5x1.5 hole 0.9: 1(0,0)
  round 1.5 hole 0.9: 2(2.54,0) 3(5.08,0) 4(7.62,0) 5(10.16,0) 6(12.7,0)
Top Overlay:
  lines w0.2: -1.27,-1.27 -1.27,1.27 13.97,1.27 13.97,-1.27 -1.27,-1.27
Mechanical 15:
  lines w0.3: -1.5,-1.5 14.2,-1.5 14.2,1.5 -1.5,1.5 -1.5,-1.5
  text ".Designator" at 5.08,0 h0.7
3D body "PinHeaderMating 1P.stp": height 6.78, standoff -3, extent 11.43,-1.46 13.97,1.46
3D body "PinHeaderMating 1P.stp": height 6.78, standoff -3, extent 8.89,-1.46 11.43,1.46
3D body "PinHeaderMating 1P.stp": height 6.78, standoff -3, extent 6.35,-1.46 8.89,1.46
3D body "PinHeaderMating 1P.stp": height 6.78, standoff -3, extent 3.81,-1.46 6.35,1.46
3D body "PinHeaderMating 1P.stp": height 6.78, standoff -3, extent 1.27,-1.46 3.81,1.46
3D body "PinHeaderMating 1P.stp": height 6.78, standoff -3, extent -1.27,-1.46 1.27,1.46

## HDR_1x2 [mil]
pads (2):
  rrect25% 60x60 hole 38: 1(0,50)
  round 62.99 hole 38: 2(0,-50)
Top Overlay:
  lines w10: -49.21,-98.43 -49.21,98.43 49.21,98.43 49.21,-98.43 -49.21,-98.43
Mechanical 15:
  lines w11.81: -66.93,-106.3 -66.93,110.24 66.93,110.24 66.93,-106.3 -66.93,-106.3
  text ".Designator" at 0,0 h27.56
3D body "PinHeaderMating 1P.stp": height 267, standoff -118, extent -57.47,0 57.49,100
3D body "PinHeaderMating 1P.stp": height 267, standoff -118, extent -57.47,-100 57.49,0

## HDR_1x2_HALF_PITCH [mm] "1.27 pitch"
pads (2):
  rrect25% 1.2x1.1 hole 0.75 mask+0.05: 1(0,0)
  oval 1.2x1.1 hole 0.75 mask+0.05: 2(0,-1.27)
Top Overlay:
  lines w0.15: -1.25,-2 1.25,-2 1.25,0.725 -1.25,0.725 -1.25,-2
Mechanical 15:
  lines w0.15: -1.275,-2.025 1.25,-2.025 1.25,0.725 -1.275,0.725 -1.275,-2.025
  text ".Designator" at 0,-1.27 h0.7
3D body "User Library-PinHeader1_27_2.STEP": height 5, standoff -2.3, extent -1.2,-1.905 1.2,0.635

## HDR_1x2_v2 [mil]
pads (2):
  rrect25% 60x60 hole 38: 1(0,50)
  round 62.99 hole 38: 2(0,-50)
Top Overlay:
  lines w10: -46.26,-81.69 -46.26,80.71 ; 46.26,-81.69 46.26,80.71
Mechanical 15:
  lines w11.81: -54.13,-99.41 57.09,-99.41 57.09,101.38 -54.13,101.38 -54.13,-99.41
  text ".Designator" at 0,0 h27.56
3D body "PinHeaderMating 1P.stp": height 267, standoff -118, extent -57.47,-100 57.49,0
3D body "PinHeaderMating 1P.stp": height 267, standoff -118, extent -57.47,0 57.49,100